# Altium integrated library Altium_WR-MJ (rev20b).IntLib: 83 symbols (continued)
## 615008150021 (continued)
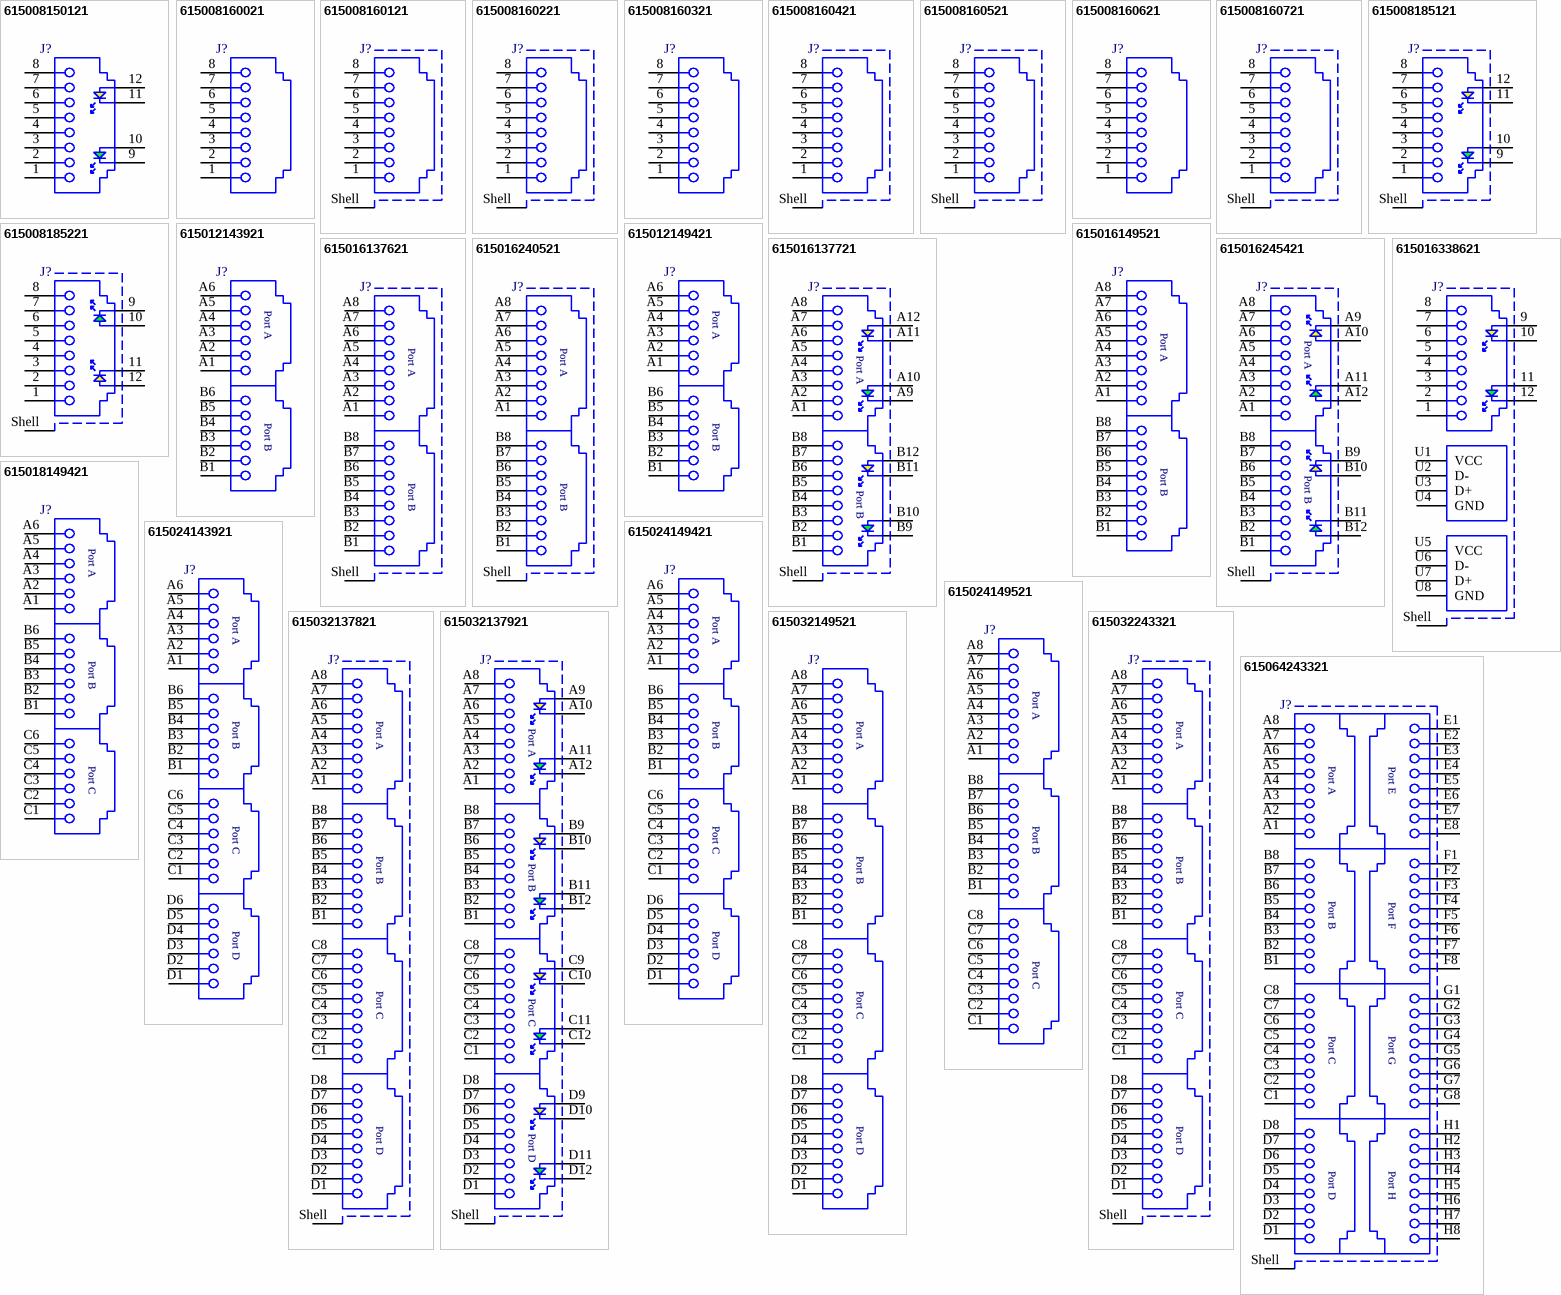
[diagram p1: symbols 615008150121 to 615064243321]

## 615008150121
designator J?
WR-MJ Modular Jack THT Horizontal Mid-Mount Plastic Tab Up 8P8C with LED Y/G; Manufacturer: Wurth Elektronik; Manufacturer Part Number: 615008150121; Rated Current: 1.5A; Contact Resistance: 20mOhm; Insulation Resistance: 1000MOhm; Working Voltage: 125VAC; Withstanding Voltage: 1000VAC; ComponentLink1Description: Manufacturer; ComponentLink1URL: http://www.we-online.de; ComponentLink2Description: Datasheet; ComponentLink2URL: https://katalog.we-online.com/em/datasheet/615008150121.pdf; Packaging: Tray; Mounting Technology: THT; Operating Temperature: -40 to +85degC; Published Date: September 2020; xPxC: 8P8C; Type: Horizontal
footprint 615008150121
pins: 1, 2, 3, 4, 5, 6, 7, 8, 9, 10, 11, 12

## 615008160021
designator J?
WR-MJ Modular Jack THT Horizontal Plastic 8P8C Tab Up; Manufacturer: Wurth Elektronik; Manufacturer Part Number: 615008160021; Rated Current: 1.5A; Contact Resistance: 20mOhm; Insulation Resistance: 1000MOhm; Working Voltage: 150VAC; Withstanding Voltage: 1000VAC; ComponentLink1Description: Manufacturer; ComponentLink1URL: http://www.we-online.de; ComponentLink2Description: Datasheet; ComponentLink2URL: https://katalog.we-online.com/em/datasheet/615008160021.pdf; Packaging: Tray; Mounting Technology: THT; Operating Temperature: -40 to +85degC; Published Date: September 2020; xPxC: 8P8C; Type: Horizontal
footprint 615008160021
pins: 1, 2, 3, 4, 5, 6, 7, 8

## 615008160121
designator J?
WR-MJ Modular Jack THT Horizontal Shielded 8P8C Tab Up; Manufacturer: Wurth Elektronik; Manufacturer Part Number: 615008160121; Rated Current: 1.5A; Contact Resistance: 35mOhm; Insulation Resistance: 1000MOhm; Working Voltage: 125VAC; Withstanding Voltage: 1000VAC; ComponentLink1Description: Manufacturer; ComponentLink1URL: http://www.we-online.de; ComponentLink2Description: Datasheet; ComponentLink2URL: https://katalog.we-online.com/em/datasheet/615008160121.pdf; Packaging: Tray; Mounting Technology: THT; Operating Temperature: -40 to +85degC; Published Date: September 2020; xPxC: 8P8C; Type: Horizontal
footprint 615008160121
pins: 1, 2, 3, 4, 5, 6, 7, 8, Shell

## 615008160221
designator J?
WR-MJ Modular Jack THT Horizontal Shielded EMI 8P8C Tab Up; Manufacturer: Wurth Elektronik; Manufacturer Part Number: 615008160221; Rated Current: 1.5A; Contact Resistance: 20mOhm; Insulation Resistance: 1000MOhm; Working Voltage: 150VAC; Withstanding Voltage: 1000VAC; ComponentLink1Description: Manufacturer; ComponentLink1URL: http://www.we-online.de; ComponentLink2Description: Datasheet; ComponentLink2URL: https://katalog.we-online.com/em/datasheet/615008160221.pdf; Packaging: Tray; Mounting Technology: THT; Operating Temperature: -40 to +85degC; Published Date: September 2020; xPxC: 8P8C; Type: Horizontal
footprint 615008160221
pins: 1, 2, 3, 4, 5, 6, 7, 8, Shell

## 615008160321
designator J?
WR-MJ Modular Jack THT Vertical Plastic 8P8C; Manufacturer: Wurth Elektronik; Manufacturer Part Number: 615008160321; Rated Current: 1.5A; Contact Resistance: 35mOhm; Insulation Resistance: 1000MOhm; Working Voltage: 125VAC; Withstanding Voltage: 1000VAC; ComponentLink1Description: Manufacturer; ComponentLink1URL: http://www.we-online.de; ComponentLink2Description: Datasheet; ComponentLink2URL: https://katalog.we-online.com/em/datasheet/615008160321.pdf; Packaging: Tray; Mounting Technology: THT; Operating Temperature: -40 to +85degC; Published Date: September 2020; xPxC: 8P8C; Type: Vertical
footprint 615008160321
pins: 1, 2, 3, 4, 5, 6, 7, 8

## 615008160421
designator J?
WR-MJ Modular Jack THT Vertical Shielded 8P8C; Manufacturer: Wurth Elektronik; Manufacturer Part Number: 615008160421; Rated Current: 1.5A; Contact Resistance: 35mOhm; Insulation Resistance: 1000MOhm; Working Voltage: 125VAC; Withstanding Voltage: 1000VAC; ComponentLink1Description: Manufacturer; ComponentLink1URL: http://www.we-online.de; ComponentLink2Description: Datasheet; ComponentLink2URL: https://katalog.we-online.com/em/datasheet/615008160421.pdf; Packaging: Tray; Mounting Technology: THT; Operating Temperature: -40 to +85degC; Published Date: September 2020; xPxC: 8P8C; Type: Vertical
footprint 615008160421
pins: 1, 2, 3, 4, 5, 6, 7, 8, Shell

## 615008160521
designator J?
WR-MJ Modular Jack THT Vertical Shielded EMI 8P8C; Manufacturer: Wurth Elektronik; Manufacturer Part Number: 615008160521; Rated Current: 1.5A; Contact Resistance: 35mOhm; Insulation Resistance: 1000MOhm; Working Voltage: 125VAC; Withstanding Voltage: 1000VAC; ComponentLink1Description: Manufacturer; ComponentLink1URL: http://www.we-online.de; ComponentLink2Description: Datasheet; ComponentLink2URL: https://katalog.we-online.com/em/datasheet/615008160521.pdf; Packaging: Tray; Mounting Technology: THT; Operating Temperature: -40 to +85degC; Published Date: September 2020; xPxC: 8P8C; Type: Vertical
footprint 615008160521
pins: 1, 2, 3, 4, 5, 6, 7, 8, Shell

## 615008160621
designator J?
WR-MJ Modular Jack THT 47.5deg 8P8C; Manufacturer: Wurth Elektronik; Manufacturer Part Number: 615008160621; Rated Current: 1.5A; Contact Resistance: 35mOhm; Insulation Resistance: 1000MOhm; Working Voltage: 125VAC; Withstanding Voltage: 1000VAC; ComponentLink1Description: Manufacturer; ComponentLink1URL: http://www.we-online.de; ComponentLink2Description: Datasheet; ComponentLink2URL: https://katalog.we-online.com/em/datasheet/615008160621.pdf; Packaging: Tray; Mounting Technology: THT; Operating Temperature: -40 to +85degC; Published Date: September 2020; xPxC: 8P8C; Type: 47.5deg
footprint 615008160621
pins: 1, 2, 3, 4, 5, 6, 7, 8

## 615008160721
designator J?
WR-MJ Modular Jack THT 47.5deg Shielded 8P8C; Manufacturer: Wurth Elektronik; Manufacturer Part Number: 615008160721; Rated Current: 1.5A; Contact Resistance: 35mOhm; Insulation Resistance: 1000MOhm; Working Voltage: 125VAC; Withstanding Voltage: 1000VAC; ComponentLink1Description: Manufacturer; ComponentLink1URL: http://www.we-online.de; ComponentLink2Description: Datasheet; ComponentLink2URL: https://katalog.we-online.com/em/datasheet/615008160721.pdf; Packaging: Tray; Mounting Technology: THT; Operating Temperature: -40 to +85degC; Published Date: September 2020; xPxC: 8P8C; Type: 47.5deg
footprint 615008160721
pins: 1, 2, 3, 4, 5, 6, 7, 8, Shell

## 615008185121
designator J?
WR-MJ Modular Jack THT Horizontal Shielded Low Profile with LED 8P8C Tab Up; Manufacturer: Wurth Elektronik; Manufacturer Part Number: 615008185121; Rated Current: 1.5A; Contact Resistance: 30mOhm; Insulation Resistance: 1000MOhm; Working Voltage: 125VAC; Withstanding Voltage: 1000VAC; ComponentLink1Description: Manufacturer; ComponentLink1URL: http://www.we-online.de; ComponentLink2Description: Datasheet; ComponentLink2URL: https://katalog.we-online.com/em/datasheet/615008185121.pdf; Packaging: Tape and Reel; Mounting Technology: THT; Operating Temperature: -40 to +85degC; Published Date: September 2020; xPxC: 8P8C; Type: Horizontal
footprint 615008185121
pins: 1, 2, 3, 4, 5, 6, 7, 8, 9, 10, 11, 12, Shell

## 615008185221
designator J?
WR-MJ Modular Jack THT Horizontal Shielded with LED and EMI Panel Finger 8P8C Tab Down; Manufacturer: Wurth Elektronik; Manufacturer Part Number: 615008185221; Rated Current: 1.5A; Contact Resistance: 30mOhm; Insulation Resistance: 1000MOhm; Working Voltage: 125VAC; Withstanding Voltage: 1000VAC; ComponentLink1Description: Manufacturer; ComponentLink1URL: http://www.we-online.de; ComponentLink2Description: Datasheet; ComponentLink2URL: https://katalog.we-online.com/em/datasheet/615008185221.pdf; Packaging: Tray; Mounting Technology: THT; Operating Temperature: -40 to +85degC; Published Date: September 2020; xPxC: 8P8C; Type: Horizontal
footprint 615008185221
pins: 1, 2, 3, 4, 5, 6, 7, 8, 9, 10, 11, 12, Shell

## 615012143921
designator J?
WR-MJ Modular Jack THT Horizontal Plastic Dual Port 6P6C Tab Up; Manufacturer: Wurth Elektronik; Manufacturer Part Number: 615012143921; Rated Current: 1.5A; Contact Resistance: 20mOhm; Insulation Resistance: 500MOhm; Working Voltage: 120VAC; Withstanding Voltage: 1000VAC; ComponentLink1Description: Manufacturer; ComponentLink1URL: http://www.we-online.de; ComponentLink2Description: Datasheet; ComponentLink2URL: https://katalog.we-online.com/em/datasheet/615012143921.pdf; Packaging: Tray; Mounting Technology: THT; Operating Temperature: -40 to +85degC; Published Date: September 2020; xPxC: 6P6C; Type: Horizontal
footprint 615012143921
pins: A1, A2, A3, A4, A5, A6, B1, B2, B3, B4, B5, B6
text: Port A; Port B

## 615012149421
designator J?
WR-MJ Modular Jack THT Horizontal Plastic 6P6C Assembly Tab Up; Manufacturer: Wurth Elektronik; Manufacturer Part Number: 615012149421; Rated Current: 1.5A; Contact Resistance: 20mOhm; Insulation Resistance: 500MOhm; Working Voltage: 120VAC; Withstanding Voltage: 1000VAC; ComponentLink1Description: Manufacturer; ComponentLink1URL: http://www.we-online.de; ComponentLink2Description: Datasheet; ComponentLink2URL: https://katalog.we-online.com/em/datasheet/615012149421.pdf; Packaging: Tray; Mounting Technology: THT; Operating Temperature: -40 to +85degC; Published Date: September 2020; xPxC: 6P6C; Type: Horizontal
footprint 615012149421
pins: A1, A2, A3, A4, A5, A6, B1, B2, B3, B4, B5, B6
text: Port A; Port B

## 615016137621
designator J?
WR-MJ Modular Jack THT Horizontal Shielded Dual Port 8P8C Tab Down; Manufacturer: Wurth Elektronik; Manufacturer Part Number: 615016137621; Rated Current: 1.5A; Contact Resistance: 20mOhm; Insulation Resistance: 500MOhm; Working Voltage: 120VAC; Withstanding Voltage: 1000VAC; ComponentLink1Description: Manufacturer; ComponentLink1URL: http://www.we-online.de; ComponentLink2Description: Datasheet; ComponentLink2URL: https://katalog.we-online.com/em/datasheet/615016137621.pdf; Packaging: Tray; Mounting Technology: THT; Operating Temperature: -40 to +85degC; Published Date: September 2020; xPxC: 8P8C; Type: Horizontal
footprint 615016137621
pins: A1, A2, A3, A4, A5, A6, A7, A8, B1, B2, B3, B4, B5, B6, B7, B8, Shell
text: Port A; Port B

## 615016137721
designator J?
WR-MJ Modular Jack THT Horizontal Shielded Dual Port with EMI Panel Finger 8P8C Tab Up; Manufacturer: Wurth Elektronik; Manufacturer Part Number: 615016137721; Rated Current: 1.5A; Contact Resistance: 20mOhm; Insulation Resistance: 500MOhm; Working Voltage: 120VAC; Withstanding Voltage: 1000VAC; ComponentLink1Description: Manufacturer; ComponentLink1URL: http://www.we-online.de; ComponentLink2Description: Datasheet; ComponentLink2URL: https://katalog.we-online.com/em/datasheet/615016137721.pdf; Packaging: Tray; Mounting Technology: THT; Operating Temperature: -40 to +85degC; Published Date: September 2020; xPxC: 8P8C; Type: Horizontal
footprint 615016137721
pins: A1, A2, A3, A4, A5, A6, A7, A8, A9, A10, A11, A12, B1, B2, B3, B4, B5, B6, B7, B8, B9, B10, B11, B12, Shell
text: Port A; Port B

## 615016149521
designator J?
WR-MJ Modular Jack THT Horizontal Plastic 8P8C Assembly Tab Up; Manufacturer: Wurth Elektronik; Manufacturer Part Number: 615016149521; Rated Current: 1.5A; Contact Resistance: 20mOhm; Insulation Resistance: 500MOhm; Working Voltage: 120VAC; Withstanding Voltage: 1000VAC; ComponentLink1Description: Manufacturer; ComponentLink1URL: http://www.we-online.de; ComponentLink2Description: Datasheet; ComponentLink2URL: https://katalog.we-online.com/em/datasheet/615016149521.pdf; Packaging: Tray; Mounting Technology: THT; Operating Temperature: -40 to +85degC; Published Date: September 2020; xPxC: 8P8C; Type: Horizontal
footprint 615016149521
pins: A1, A2, A3, A4, A5, A6, A7, A8, B1, B2, B3, B4, B5, B6, B7, B8
text: Port A; Port B

## 615016240521
designator J?
WR-MJ Modular Jack THT Horizontal Shielded Dual Stacked with EMI Panel Finger 8P8C Tab Up&Down; Manufacturer: Wurth Elektronik; Manufacturer Part Number: 615016240521; Rated Current: 1.5A; Contact Resistance: 20mOhm; Insulation Resistance: 500MOhm; Working Voltage: 120VAC; Withstanding Voltage: 1000VAC; ComponentLink1Description: Manufacturer; ComponentLink1URL: http://www.we-online.de; ComponentLink2Description: Datasheet; ComponentLink2URL: https://katalog.we-online.com/em/datasheet/615016240521.pdf; Packaging: Tray; Mounting Technology: THT; Operating Temperature: -40 to +85degC; Published Date: September 2020; xPxC: 8P8C; Type: Horizontal
footprint 615016240521
pins: A1, A2, A3, A4, A5, A6, A7, A8, B1, B2, B3, B4, B5, B6, B7, B8, Shell
text: Port A; Port B

## 615016245421
designator J?
WR-MJ Modular Jack THT Horizontal Shielded Dual Stacked with LED and EMI Panel Finger 8P8C Tab Up&Down; Manufacturer: Wurth Elektronik; Manufacturer Part Number: 615016245421; Rated Current: 1.5A; Contact Resistance: 20mOhm; Insulation Resistance: 500MOhm; Working Voltage: 120VAC; Withstanding Voltage: 1000VAC; ComponentLink1Description: Manufacturer; ComponentLink1URL: http://www.we-online.de; ComponentLink2Description: Datasheet; ComponentLink2URL: https://katalog.we-online.com/em/datasheet/615016245421.pdf; Packaging: Tray; Mounting Technology: THT; Operating Temperature: -40 to +85degC; Published Date: September 2020; xPxC: 8P8C; Type: Horizontal
footprint 615016245421
pins: A1, A2, A3, A4, A5, A6, A7, A8, A9, A10, A11, A12, B1, B2, B3, B4, B5, B6, B7, B8, B9, B10, B11, B12, Shell
text: Port A; Port B

## 615016338621
designator J?
WR-MJ Modular Jack THT Horizontal Tab Up with LED 8P8C Dual USB; Manufacturer: Wurth Elektronik; Manufacturer Part Number: 615016338621; Rated Current: 1.5A; Contact Resistance: 20mOhm; Insulation Resistance: 500MOhm; Working Voltage: 120VAC; Withstanding Voltage: 1000VAC; ComponentLink1Description: Manufacturer; ComponentLink1URL: http://www.we-online.de; ComponentLink2Description: Datasheet; ComponentLink2URL: https://katalog.we-online.com/em/datasheet/615016338621.pdf; Packaging: Tray; Mounting Technology: THT; Operating Temperature: -25 to +85degC; Published Date: September 2020; xPxC: 8P8C; Type: Horizontal
footprint 615016338621
pins: 1, 2, 3, 4, 5, 6, 7, 8, 9, 10, 11, 12, Shell, U1 VCC, U2 D-, U3 D+, U4 GND, U5 VCC, U6 D-, U7 D+, U8 GND

## 615018149421
designator J?
WR-MJ Modular Jack THT Horizontal Plastic 6P6C Assembly Tab Up; Manufacturer: Wurth Elektronik; Manufacturer Part Number: 615018149421; Rated Current: 1.5A; Contact Resistance: 20mOhm; Insulation Resistance: 500MOhm; Working Voltage: 120VAC; Withstanding Voltage: 1000VAC; ComponentLink1Description: Manufacturer; ComponentLink1URL: http://www.we-online.de; ComponentLink2Description: Datasheet; ComponentLink2URL: https://katalog.we-online.com/em/datasheet/615018149421.pdf; Packaging: Tray; Mounting Technology: THT; Operating Temperature: -40 to +85degC; Published Date: September 2020; xPxC: 6P6C; Type: Horizontal
footprint 615018149421
pins: A1, A2, A3, A4, A5, A6, B1, B2, B3, B4, B5, B6, C1, C2, C3, C4, C5, C6
text: Port A; Port B; Port C

## 615024143921
designator J?
WR-MJ Modular Jack THT Horizontal Plastic 4Port 6P6C Tab Up; Manufacturer: Wurth Elektronik; Manufacturer Part Number: 615024143921; Rated Current: 1.5A; Contact Resistance: 20mOhm; Insulation Resistance: 500MOhm; Working Voltage: 120VAC; Withstanding Voltage: 1000VAC; ComponentLink1Description: Manufacturer; ComponentLink1URL: http://www.we-online.de; ComponentLink2Description: Datasheet; ComponentLink2URL: https://katalog.we-online.com/em/datasheet/615024143921.pdf; Packaging: Tray; Mounting Technology: THT; Operating Temperature: -40 to +85degC; Published Date: September 2020; xPxC: 6P6C; Type: Horizontal
footprint 615024143921
pins: A1, A2, A3, A4, A5, A6, B1, B2, B3, B4, B5, B6, C1, C2, C3, C4, C5, C6, D1, D2, D3, D4, D5, D6
text: Port A; Port B; Port C; Port D

## 615024149421
designator J?
WR-MJ Modular Jack THT Horizontal Plastic 6P6C Assembly Tab Up; Manufacturer: Wurth Elektronik; Manufacturer Part Number: 615024149421; Rated Current: 1.5A; Contact Resistance: 20mOhm; Insulation Resistance: 500MOhm; Working Voltage: 120VAC; Withstanding Voltage: 1000VAC; ComponentLink1Description: Manufacturer; ComponentLink1URL: http://www.we-online.de; ComponentLink2Description: Datasheet; ComponentLink2URL: https://katalog.we-online.com/em/datasheet/615024149421.pdf; Packaging: Tray; Mounting Technology: THT; Operating Temperature: -40 to +85degC; Published Date: September 2020; xPxC: 6P6C; Type: Horizontal
footprint 615024149421
pins: A1, A2, A3, A4, A5, A6, B1, B2, B3, B4, B5, B6, C1, C2, C3, C4, C5, C6, D1, D2, D3, D4, D5, D6
text: Port A; Port B; Port C; Port D

## 615024149521
designator J?
WR-MJ Modular Jack THT Horizontal Plastic 8P8C Assembly Tab Up; Manufacturer: Wurth Elektronik; Manufacturer Part Number: 615024149521; Rated Current: 1.5A; Contact Resistance: 20mOhm; Insulation Resistance: 500MOhm; Working Voltage: 120VAC; Withstanding Voltage: 1000VAC; ComponentLink1Description: Manufacturer; ComponentLink1URL: http://www.we-online.de; ComponentLink2Description: Datasheet; ComponentLink2URL: https://katalog.we-online.com/em/datasheet/615024149521.pdf; Packaging: Tray; Mounting Technology: THT; Operating Temperature: -40 to +85degC; Published Date: September 2020; xPxC: 8P8C; Type: Horizontal
footprint 615024149521
pins: A1, A2, A3, A4, A5, A6, A7, A8, B1, B2, B3, B4, B5, B6, B7, B8, C1, C2, C3, C4, C5, C6, C7, C8
text: Port A; Port B; Port C

## 615032137821
designator J?
WR-MJ Modular Jack THT Horizontal Shielded Ganged 4 Ports 8P8C Tab Down; Manufacturer: Wurth Elektronik; Manufacturer Part Number: 615032137821; Rated Current: 1.5A; Contact Resistance: 20mOhm; Insulation Resistance: 500MOhm; Working Voltage: 120VAC; Withstanding Voltage: 1000VAC; ComponentLink1Description: Manufacturer; ComponentLink1URL: http://www.we-online.de; ComponentLink2Description: Datasheet; ComponentLink2URL: https://katalog.we-online.com/em/datasheet/615032137821.pdf; Packaging: Tray; Mounting Technology: THT; Operating Temperature: -40 to +85degC; Published Date: September 2020; xPxC: 8P8C; Type: Horizontal
footprint 615032137821
pins: A1, A2, A3, A4, A5, A6, A7, A8, B1, B2, B3, B4, B5, B6, B7, B8, C1, C2, C3, C4, C5, C6, C7, C8, D1, D2, D3, D4, D5, D6, D7, D8, Shell
text: Port A; Port B; Port C; Port D

## 615032137921
designator J?
WR-MJ Modular Jack THT Horizontal Shielded Ganged 4 Ports with LED and EMI Panel Finger 8P8C Tab Up; Manufacturer: Wurth Elektronik; Manufacturer Part Number: 615032137921; Rated Current: 1.5A; Contact Resistance: 20mOhm; Insulation Resistance: 500MOhm; Working Voltage: 120VAC; Withstanding Voltage: 1000VAC; ComponentLink1Description: Manufacturer; ComponentLink1URL: http://www.we-online.de; ComponentLink2Description: Datasheet; ComponentLink2URL: https://katalog.we-online.com/em/datasheet/615032137921.pdf; Packaging: Tray; Mounting Technology: THT; Operating Temperature: -40 to +85degC; Published Date: September 2020; xPxC: 8P8C; Type: Horizontal
footprint 615032137921
pins: A1, A2, A3, A4, A5, A6, A7, A8, A9, A10, A11, A12, B1, B2, B3, B4, B5, B6, B7, B8, B9, B10, B11, B12, C1, C2, C3, C4, C5, C6, C7, C8, C9, C10, C11, C12, D1, D2, D3, D4, D5, D6, D7, D8, D9, D10, D11, D12, Shell
text: Port A; Port B; Port C; Port D

## 615032149521
designator J?
WR-MJ Modular Jack THT Horizontal Plastic 8P8C Assembly Tab Up; Manufacturer: Wurth Elektronik; Manufacturer Part Number: 615032149521; Rated Current: 1.5A; Contact Resistance: 20mOhm; Insulation Resistance: 500MOhm; Working Voltage: 120VAC; Withstanding Voltage: 1000VAC; ComponentLink1Description: Manufacturer; ComponentLink1URL: http://www.we-online.de; ComponentLink2Description: Datasheet; ComponentLink2URL: https://katalog.we-online.com/em/datasheet/615032149521.pdf; Packaging: Tray; Mounting Technology: THT; Operating Temperature: -40 to +85degC; Published Date: September 2020; xPxC: 8P8C; Type: Horizontal
footprint 615032149521
pins: A1, A2, A3, A4, A5, A6, A7, A8, B1, B2, B3, B4, B5, B6, B7, B8, C1, C2, C3, C4, C5, C6, C7, C8, D1, D2, D3, D4, D5, D6, D7, D8
text: Port A; Port B; Port C; Port D

## 615032243321
designator J?
WR-MJ Modular Jack THT Horizontal Shielded 2x Dual Stacked with EMI Panel Finger 8P8C Tab Up&Down; Manufacturer: Wurth Elektronik; Manufacturer Part Number: 615032243321; Rated Current: 1.5A; Contact Resistance: 20mOhm; Insulation Resistance: 500MOhm; Working Voltage: 120VAC; Withstanding Voltage: 1000VAC; ComponentLink1Description: Manufacturer; ComponentLink1URL: http://www.we-online.de; ComponentLink2Description: Datasheet; ComponentLink2URL: https://katalog.we-online.com/em/datasheet/615032243321.pdf; Packaging: Tray; Mounting Technology: THT; Operating Temperature: -40 to +85degC; Published Date: September 2020; xPxC: 8P8C; Type: Horizontal
footprint 615032243321
pins: A1, A2, A3, A4, A5, A6, A7, A8, B1, B2, B3, B4, B5, B6, B7, B8, C1, C2, C3, C4, C5, C6, C7, C8, D1, D2, D3, D4, D5, D6, D7, D8, Shell
text: Port A; Port B; Port C; Port D

## 615064243321
designator J?
WR-MJ Modular Jack THT Horizontal Shielded 2x4 Stacked with EMI Panel Finger 8P8C Tab Up&Down; Manufacturer: Wurth Elektronik; Manufacturer Part Number: 615064243321; Rated Current: 1.5A; Contact Resistance: 20mOhm; Insulation Resistance: 500MOhm; Working Voltage: 120VAC; Withstanding Voltage: 1000VAC; ComponentLink1Description: Manufacturer; ComponentLink1URL: http://www.we-online.de; ComponentLink2Description: Datasheet; ComponentLink2URL: https://katalog.we-online.com/em/datasheet/615064243321.pdf; Packaging: Tray; Mounting Technology: THT; Operating Temperature: -40 to +85degC; Published Date: September 2020; xPxC: 8P8C; Type: Horizontal
footprint 615064243321
pins: A1, A2, A3, A4, A5, A6, A7, A8, B1, B2, B3, B4, B5, B6, B7, B8, C1, C2, C3, C4, C5, C6, C7, C8, D1, D2, D3, D4, D5, D6, D7, D8, E1, E2, E3, E4, E5, E6, E7, E8, F1, F2, F3, F4, F5, F6, F7, F8, G1, G2, G3, G4, G5, G6, G7, G8, H1, H2, H3, H4, H5, H6, H7, H8, Shell
text: Port A; Port E; Port B; Port F; Port C; Port G; Port D; Port H

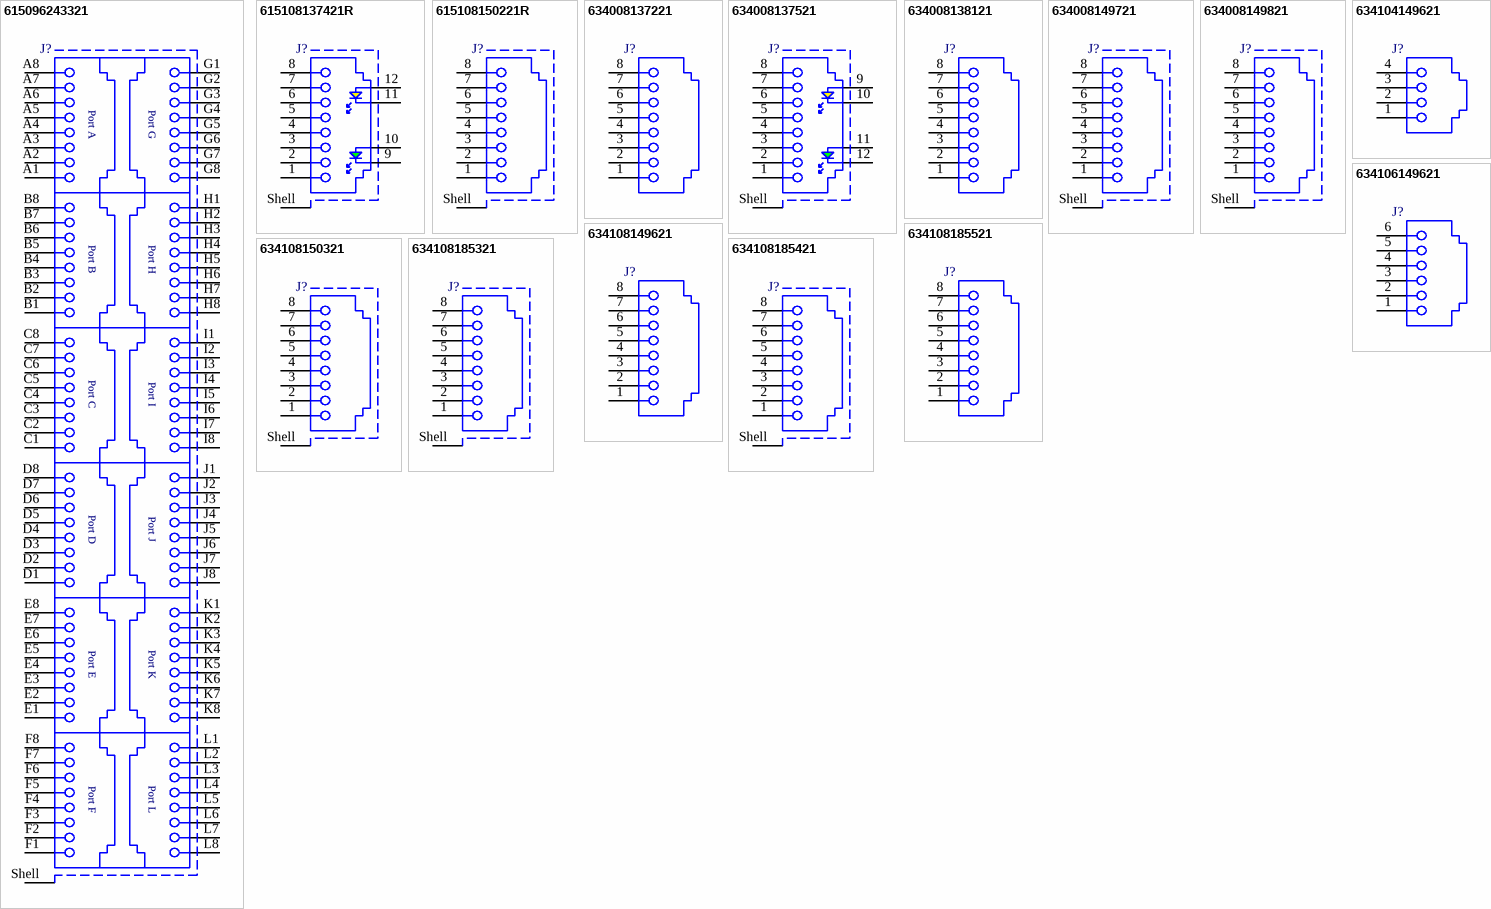
[diagram p2: symbols 615096243321 to 634108185521]

## 615096243321
designator J?
WR-MJ Modular Jack THT Horizontal Shielded 2x6 Stacked with EMI Panel Finger 8P8C Tab Up&Down; Manufacturer: Wurth Elektronik; Manufacturer Part Number: 615096243321; Rated Current: 1.5A; Contact Resistance: 20mOhm; Insulation Resistance: 500MOhm; Working Voltage: 120VAC; Withstanding Voltage: 1000VAC; ComponentLink1Description: Manufacturer; ComponentLink1URL: http://www.we-online.de; ComponentLink2Description: Datasheet; ComponentLink2URL: https://katalog.we-online.com/em/datasheet/615096243321.pdf; Packaging: Tray; Mounting Technology: THT; Operating Temperature: -40 to +85degC; Published Date: September 2020; xPxC: 8P8C; Type: Horizontal
footprint 615096243321
pins: A1, A2, A3, A4, A5, A6, A7, A8, B1, B2, B3, B4, B5, B6, B7, B8, C1, C2, C3, C4, C5, C6, C7, C8, D1, D2, D3, D4, D5, D6, D7, D8, E1, E2, E3, E4, E5, E6, E7, E8, F1, F2, F3, F4, F5, F6, F7, F8, G1, G2, G3, G4, G5, G6, G7, G8, H1, H2, H3, H4, H5, H6, H7, H8, I1, I2, I3, I4, I5, I6, I7, I8, J1, J2, J3, J4, J5, J6, J7, J8, K1, K2, K3, K4, K5, K6, K7, K8, L1, L2, L3, L4, L5, L6, L7, L8, Shell
text: Port A; Port G; Port B; Port H; Port C; Port I; Port D; Port J; Port E; Port K; Port F; Port L

## 615108137421R
designator J?
WR-MJ Modular Jack THR Horizontal Shielded with LED and EMI Finger 8P8C Tab Up; Manufacturer: Wurth Elektronik; Manufacturer Part Number: 615108137421R; Rated Current: 1.5A; Contact Resistance: 30mOhm; Insulation Resistance: 1000MOhm; Working Voltage: 125VAC; Withstanding Voltage: 1000VAC; ComponentLink1Description: Manufacturer; ComponentLink1URL: http://www.we-online.de; ComponentLink2Description: Datasheet; ComponentLink2URL: https://katalog.we-online.com/em/datasheet/615108137421R.pdf; Packaging: Tape and Reel; Mounting Technology: THR; Operating Temperature: -40 to +85degC; Published Date: September 2020; xPxC: 8P8C; Type: Horizontal
footprint 615108137421R
pins: 1, 2, 3, 4, 5, 6, 7, 8, 9, 10, 11, 12, Shell

## 615108150221R
designator J?
WR-MJ Modular Jack THR Horizontal Mid-Mount Shielded 8P8C Tab Down; Manufacturer: Wurth Elektronik; Manufacturer Part Number: 615108150221R; Rated Current: 1.5A; Contact Resistance: 20mOhm; Insulation Resistance: 1000MOhm; Working Voltage: 125VAC; Withstanding Voltage: 1000VAC; ComponentLink1Description: Manufacturer; ComponentLink1URL: http://www.we-online.de; ComponentLink2Description: Datasheet; ComponentLink2URL: https://katalog.we-online.com/em/datasheet/615108150221R.pdf; Packaging: Tape and Reel; Mounting Technology: THR; Operating Temperature: -40 to +85degC; Published Date: September 2020; xPxC: 8P8C; Type: Horizontal
footprint 615108150221R
pins: 1, 2, 3, 4, 5, 6, 7, 8, Shell

## 634008137221
designator J?
WR-MJ Modular Jack SMT Horizontal Plastic 8P8C Tab Down; Manufacturer: Wurth Elektronik; Manufacturer Part Number: 634008137221; Rated Current: 1.5A; Contact Resistance: 20mOhm; Insulation Resistance: 500MOhm; Working Voltage: 120VAC; Withstanding Voltage: 1000VAC; ComponentLink1Description: Manufacturer; ComponentLink1URL: http://www.we-online.de; ComponentLink2Description: Datasheet; ComponentLink2URL: https://katalog.we-online.com/em/datasheet/634008137221.pdf; Packaging: Tray; Mounting Technology: SMT; Operating Temperature: -40 to +85degC; Published Date: September 2020; xPxC: 8P8C; Type: Horizontal
footprint 634008137221
pins: 1, 2, 3, 4, 5, 6, 7, 8

## 634008137521
designator J?
WR-MJ Modular Jack SMT Horizontal Shielded with LED and EMI Panel Finger 8P8C Tab Up; Manufacturer: Wurth Elektronik; Manufacturer Part Number: 634008137521; Rated Current: 1.5A; Contact Resistance: 20mOhm; Insulation Resistance: 500MOhm; Working Voltage: 120VAC; Withstanding Voltage: 1000VAC; ComponentLink1Description: Manufacturer; ComponentLink1URL: http://www.we-online.de; ComponentLink2Description: Datasheet; ComponentLink2URL: https://katalog.we-online.com/em/datasheet/634008137521.pdf; Packaging: Tape and Reel; Mounting Technology: SMT; Operating Temperature: -40 to +85degC; Published Date: September 2020; xPxC: 8P8C; Type: Horizontal
footprint 634008137521
pins: 1, 2, 3, 4, 5, 6, 7, 8, 9, 10, 11, 12, Shell

## 634008138121
designator J?
WR-MJ Modular Jack SMT Vertical Plastic 8P8C; Manufacturer: Wurth Elektronik; Manufacturer Part Number: 634008138121; Rated Current: 1.5A; Contact Resistance: 20mOhm; Insulation Resistance: 500MOhm; Working Voltage: 120VAC; Withstanding Voltage: 1000VAC; ComponentLink1Description: Manufacturer; ComponentLink1URL: http://www.we-online.de; ComponentLink2Description: Datasheet; ComponentLink2URL: https://katalog.we-online.com/em/datasheet/634008138121.pdf; Packaging: Tray; Mounting Technology: SMT; Operating Temperature: -40 to +85degC; Published Date: September 2020; xPxC: 8P8C; Type: Vertical
footprint 634008138121
pins: 1, 2, 3, 4, 5, 6, 7, 8

## 634008149721
designator J?
WR-MJ Modular Jack SMT Horizontal Shielded with EMI Panel Finger 8P8C; Manufacturer: Wurth Elektronik; Manufacturer Part Number: 634008149721; Rated Current: 1.5A; Contact Resistance: 20mOhm; Insulation Resistance: 500MOhm; Working Voltage: 120VAC; Withstanding Voltage: 1000VAC; ComponentLink1Description: Manufacturer; ComponentLink1URL: http://www.we-online.de; ComponentLink2Description: Datasheet; ComponentLink2URL: https://katalog.we-online.com/em/datasheet/634008149721.pdf; Packaging: Tray; Mounting Technology: SMT; Operating Temperature: -40 to +85degC; Published Date: September 2020; xPxC: 8P8C; Type: Horizontal
footprint 634008149721
pins: 1, 2, 3, 4, 5, 6, 7, 8, Shell

## 634008149821
designator J?
WR-MJ Modular Jack SMT Horizontal Shielded 8P8C Tab Up; Manufacturer: Wurth Elektronik; Manufacturer Part Number: 634008149821; Rated Current: 1.5A; Contact Resistance: 20mOhm; Insulation Resistance: 500MOhm; Working Voltage: 120VAC; Withstanding Voltage: 1000VAC; ComponentLink1Description: Manufacturer; ComponentLink1URL: http://www.we-online.de; ComponentLink2Description: Datasheet; ComponentLink2URL: https://katalog.we-online.com/em/datasheet/634008149821.pdf; Packaging: Tray; Mounting Technology: SMT; Operating Temperature: -40 to +85degC; Published Date: September 2020; xPxC: 8P8C; Type: Horizontal
footprint 634008149821
pins: 1, 2, 3, 4, 5, 6, 7, 8, Shell

## 634104149621
designator J?
WR-MJ Modular Jack SMT Vertical Plastic 4P4C Top Entry; Manufacturer: Wurth Elektronik; Manufacturer Part Number: 634104149621; Rated Current: 1.5A; Contact Resistance: 20mOhm; Insulation Resistance: 500MOhm; Working Voltage: 120VAC; Withstanding Voltage: 1000VAC; ComponentLink1Description: Manufacturer; ComponentLink1URL: http://www.we-online.de; ComponentLink2Description: Datasheet; ComponentLink2URL: https://katalog.we-online.com/em/datasheet/634104149621.pdf; Packaging: Tape and Reel; Mounting Technology: SMT; Operating Temperature: -40 to +85degC; Published Date: September 2020; xPxC: 4P4C; Type: Vertical
footprint 634104149621
pins: 1, 2, 3, 4

## 634106149621
designator J?
WR-MJ Modular Jack SMT Vertical Plastic 6P6C Top Entry; Manufacturer: Wurth Elektronik; Manufacturer Part Number: 634106149621; Rated Current: 1.5A; Contact Resistance: 20mOhm; Insulation Resistance: 500MOhm; Working Voltage: 120VAC; Withstanding Voltage: 1000VAC; ComponentLink1Description: Manufacturer; ComponentLink1URL: http://www.we-online.de; ComponentLink2Description: Datasheet; ComponentLink2URL: https://katalog.we-online.com/em/datasheet/634106149621.pdf; Packaging: Tape and Reel; Mounting Technology: SMT; Operating Temperature: -40 to +85degC; Published Date: September 2020; xPxC: 6P6C; Type: Vertical
footprint 634106149621
pins: 1, 2, 3, 4, 5, 6

## 634108149621
designator J?
WR-MJ Modular Jack SMT Vertical Plastic 8P8C Top Entry; Manufacturer: Wurth Elektronik; Manufacturer Part Number: 634108149621; Rated Current: 1.5A; Contact Resistance: 20mOhm; Insulation Resistance: 500MOhm; Working Voltage: 120VAC; Withstanding Voltage: 1000VAC; ComponentLink1Description: Manufacturer; ComponentLink1URL: http://www.we-online.de; ComponentLink2Description: Datasheet; ComponentLink2URL: https://katalog.we-online.com/em/datasheet/634108149621.pdf; Packaging: Tape and Reel; Mounting Technology: SMT; Operating Temperature: -40 to +85degC; Published Date: September 2020; xPxC: 8P8C; Type: Vertical
footprint 634108149621
pins: 1, 2, 3, 4, 5, 6, 7, 8

## 634108150321
designator J?
WR-MJ Modular Jack SMT Horizontal Mid-Mount Shielded 8P8C Tab Up; Manufacturer: Wurth Elektronik; Manufacturer Part Number: 634108150321; Rated Current: 1.5A; Contact Resistance: 20mOhm; Insulation Resistance: 1000MOhm; Working Voltage: 125VAC; Withstanding Voltage: 1000VAC; ComponentLink1Description: Manufacturer; ComponentLink1URL: http://www.we-online.de; ComponentLink2Description: Datasheet; ComponentLink2URL: https://katalog.we-online.com/em/datasheet/634108150321.pdf; Packaging: Tape and Reel; Mounting Technology: SMT; Operating Temperature: -40 to +85degC; Published Date: September 2020; xPxC: 8P8C; Type: Horizontal
footprint 634108150321
pins: 1, 2, 3, 4, 5, 6, 7, 8, Shell

## 634108185321
designator J?
WR-MJ Modular Jack SMT Vertical Shielded with Solder Tab 8P8C Top Entry; Manufacturer: Wurth Elektronik; Manufacturer Part Number: 634108185321; Rated Current: 1.5A; Contact Resistance: 30mOhm; Insulation Resistance: 1000MOhm; Working Voltage: 125VAC; Withstanding Voltage: 1000VAC; ComponentLink1Description: Manufacturer; ComponentLink1URL: http://www.we-online.de; ComponentLink2Description: Datasheet; ComponentLink2URL: https://katalog.we-online.com/em/datasheet/634108185321.pdf; Packaging: Tape and Reel; Mounting Technology: SMT; Operating Temperature: -40 to +85degC; Published Date: September 2020; xPxC: 8P8C; Type: Vertical
footprint 634108185321
pins: 1, 2, 3, 4, 5, 6, 7, 8, Shell

## 634108185421
designator J?
WR-MJ Modular Jack SMT Horizontal Shielded 8P8C Tab Down; Manufacturer: Wurth Elektronik; Manufacturer Part Number: 634108185421; Rated Current: 1.5A; Contact Resistance: 35mOhm; Insulation Resistance: 1000MOhm; Working Voltage: 125VAC; Withstanding Voltage: 1000VAC; ComponentLink1Description: Manufacturer; ComponentLink1URL: http://www.we-online.de; ComponentLink2Description: Datasheet; ComponentLink2URL: https://katalog.we-online.com/em/datasheet/634108185421.pdf; Packaging: Tape and Reel; Mounting Technology: SMT; Operating Temperature: -40 to +85degC; Published Date: September 2020; xPxC: 8P8C; Type: Horizontal
footprint 634108185421
pins: 1, 2, 3, 4, 5, 6, 7, 8, Shell

## 634108185521
designator J?
WR-MJ Modular Jack SMT Horizontal Plastic 8P8C Tab Down; Manufacturer: Wurth Elektronik; Manufacturer Part Number: 634108185521; Rated Current: 1.5A; Contact Resistance: 35mOhm; Insulation Resistance: 1000MOhm; Working Voltage: 125VAC; Withstanding Voltage: 1000VAC; ComponentLink1Description: Manufacturer; ComponentLink1URL: http://www.we-online.de; ComponentLink2Description: Datasheet; ComponentLink2URL: https://katalog.we-online.com/em/datasheet/634108185521.pdf; Packaging: Tape and Reel; Mounting Technology: SMT; Operating Temperature: -40 to +85degC; Published Date: September 2020; xPxC: 8P8C; Type: Horizontal
footprint 634108185521
pins: 1, 2, 3, 4, 5, 6, 7, 8